# Altium footprint library coenv_PCBLIB.PcbLib: 25 footprints (part 2 of 2)
Each footprint in its own frame and in the unit in brackets; x right, y up, seen from the top. Pads: shape width x height; smd on the part's side, far side on the other; paste and mask are expansions set on the pad; w line width, h text height; cw(c..) or ccw(c..) is an arc to the next point about the centre after c.
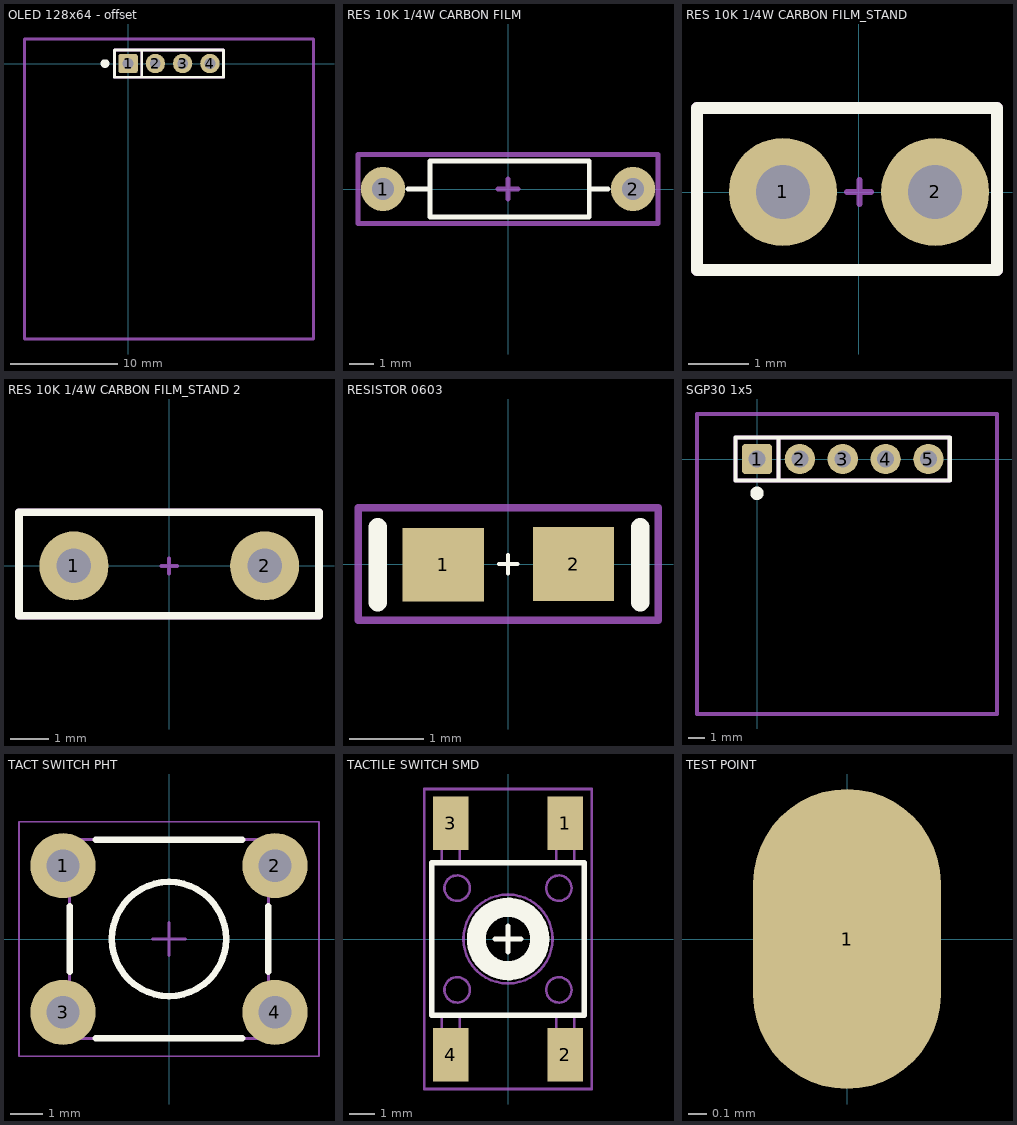
[diagram p1: the footprints below, top view; thin cyan lines are the x and y axes]

## OLED 128x64 - offset [mm] "PinHeader 1x4 TH Pitch 2.54mm"
height 9.5
pads (4):
  rrect25% 1.8x1.8 hole 1: 1(0,0)
  round 1.8 hole 1: 2(2.54,0) 3(5.08,0) 4(7.62,0)
Top Overlay:
  circle w0.5: c-2.15,0 r0.15
  lines w0.254: 1.27,-1.27 1.27,1.27 -1.27,1.27 ; -1.27,1.27 -1.27,-1.27 8.89,-1.27 8.89,1.27 -1.27,1.27
Mechanical 3:
  lines w0.254: 1.27,-1.27 1.27,1.27 -1.27,1.27 ; -1.27,1.27 -1.27,-1.27 8.89,-1.27 8.89,1.27 -1.27,1.27
Mechanical 15:
  lines w0.254: -9.652,-25.654 -9.652,2.286 17.272,2.286 17.272,-25.654 -9.652,-25.654
3D body "OLED-128x64-0.96.step": height 39.57, standoff 28.73, extent -9.525,-25.614 17.175,2.246

## RES 10K 1/4W CARBON FILM [mm]
pads (2):
  round 1.8 hole 0.9: 1(-5.08,0) 2(5.08,0)
Top Overlay:
  lines w0.2: -4.064,0 -3.175,0 ; 3.302,0 4.064,0 ; -3.175,-1.143 -3.175,1.143 3.302,1.143 3.302,-1.143 -3.175,-1.143
Mechanical 15:
  lines w0.2: -0.4,0 0.4,0 ; 0,-0.4 0,0.4 ; -6.096,-1.4 6.096,-1.4 6.096,1.4 -6.096,1.4 -6.096,-1.4
Mechanical 29:
  text "1" at -3.937,-1.016 h0.5
  text ".Designator" at -5.9,1.8 h0.5
3D body "RES 10K .25W CARBON FILM.STEP": height 3.27, standoff -1.27, extent -5.473,-1.27 5.474,1.27

## RES 10K 1/4W CARBON FILM_STAND [mm]
pads (2):
  round 1.8 hole 0.9: 1(-1.27,0) 2(1.27,0)
Top Overlay:
  lines w0.2: -2.7,-1.3 -2.7,1.4 2.3,1.4 2.3,-1.3 -2.7,-1.3
Mechanical 15:
  lines w0.1: -0.2,0 0.2,0 ; 0.01,-0.2 0.01,0.2
  lines w0.2: -2.7,-1.3 2.3,-1.3 2.3,1.4 -2.7,1.4 -2.7,-1.3
Mechanical 29:
  text "1" at -2.4,-1 h0.5
  text ".Designator" at -2.4,1.8 h0.5
3D body "RES 10K .25W CARBON FILM_STAND.STEP": height 7.82, standoff -2.03, extent -2.562,-1.2 1.562,1.34

## RES 10K 1/4W CARBON FILM_STAND 2 [mm]
pads (2):
  round 1.8 hole 0.9: 1(-2.485,0) 2(2.485,0)
Top Overlay:
  lines w0.2: -3.915,-1.3 -3.915,1.4 3.9,1.4 3.9,-1.3 -3.915,-1.3
Mechanical 15:
  lines w0.1: -0.2,0 0.2,0 ; -0.005,-0.2 -0.005,0.2
  lines w0.2: -3.915,-1.3 3.9,-1.3 3.9,1.4 -3.915,1.4 -3.915,-1.3
3D body "RES 10K .25W CARBON FILM_STAND.STEP": height 7.82, standoff -2.03, extent -3.777,-1.2 0.347,1.34

## RESISTOR 0603 [mm] "RES 5% 0603"
height 0.025
pads (2):
  rect 1.1x1 smd: 1(-0.877,-0.011) 2(0.889,0)
Top Overlay:
  lines w0.051: -0.127,0 0.127,0 ; 0,-0.127 0,0.127
  lines w0.254: -1.766,-0.519 -1.766,0.497 ; 1.79,-0.519 1.79,0.497
Mechanical 15:
  lines w0.102: -2.032,-0.762 -2.032,0.762 2.032,0.762 2.032,-0.762 -2.032,-0.762
3D body "SW3dPS-0603 SMD Resistor.STEP": height 0.3, standoff 0, extent -0.8,-0.4 0.8,0.4

## SGP30 1x5 [mm] "PinHeader 1x6 TH Pitch 2.54mm"
height 9.5
pads (5):
  rrect25% 1.8x1.8 hole 1: 1(0,0)
  round 1.8 hole 1: 2(2.54,0) 3(5.08,0) 4(7.62,0) 5(10.16,0)
Top Overlay:
  circle w0.5: c0,-2.032 r0.15
  lines w0.254: 1.27,-1.27 1.27,1.27 -1.27,1.27 ; -1.27,1.27 11.43,1.27 11.43,-1.27 -1.27,-1.27 -1.27,1.27
Mechanical 3:
  lines w0.254: 1.27,-1.27 1.27,1.27 -1.27,1.27 ; -1.27,1.27 11.43,1.27 11.43,-1.27 -1.27,-1.27 -1.27,1.27
Mechanical 13:
  lines w0.254: -3.556,-15.113 -3.556,2.667 14.224,2.667 14.224,-15.113 -3.556,-15.113
3D body "Pin Header 1x3 TH Pitch 2.54mm.stp": height 5.99, standoff -6.7, extent 3.81,-1.27 11.43,1.27
3D body "Pin Header 1x3 TH Pitch 2.54mm.stp": height 5.99, standoff -6.7, extent -1.27,-1.27 6.35,1.27
3D body "Adafruit_VEML6070_breakout.stp": height 5.64, standoff 2.79, extent -1.27,-11.43 11.43,2.54

## TACT SWITCH PHT [mm] "Tactile Switch 6x6x7mm"
height 7
pads (4):
  round 2 hole 1: 1(-3.25,2.25) 2(3.25,2.25) 3(-3.25,-2.25) 4(3.25,-2.25)
Top Overlay:
  circle w0.2: c0,0 r1.75
  lines w0.2: -3.05,-1 -3.05,1 ; -2.25,-3.05 2.25,-3.05 ; -2.25,3.05 2.25,3.05 ; 3.05,-1 3.05,1
Mechanical 13:
  circle w0.1: c0,0 r1.75
  lines w0.1: -3.05,-3.05 3.05,-3.05 3.05,3.05 -3.05,3.05 -3.05,-3.05
Mechanical 15:
  lines w0.05: -4.6,-3.6 -4.6,3.6 4.6,3.6 4.6,-3.6 -4.6,-3.6
  lines w0.1: -0.5,0 0.5,0 ; 0,-0.5 0,0.5
Mechanical 29:
  text ".Designator" at 0,0 h2
3D body "TACT SWITCH 7MM.STEP": height 7, standoff -3.5, extent -3.95,-3.1 3.95,3.1

## TACTILE SWITCH SMD [mm] "TACTILE SWITCH 4.3MM"
height 4.3
pads (4):
  rect 1.4x2.1 smd: 1(2.25,4.55) 2(2.25,-4.55) 3(-2.25,4.55) 4(-2.25,-4.55)
Top Overlay:
  circle w0.75: c0,0 r1.25
  lines w0.2: -0.508,0 0.508,0 ; 0,-0.508 0,0.508 ; -3,-3 3,-3 3,3 -3,3 -3,-3
Mechanical 13:
  circle w0.1: c0,0 r1.75
  circle w0.1: c-2,2 r0.5
  circle w0.1: c2,-2 r0.5
  circle w0.1: c2,2 r0.5
  circle w0.1: c-2,-2 r0.5
  lines w0.1: -2.6,-3 -2.6,-4.5 -1.9,-4.5 -1.9,-3 ; -2.6,3 -2.6,4.5 -1.9,4.5 -1.9,3 ; 1.9,-3 1.9,-4.5 2.6,-4.5 2.6,-3 ; 1.9,3 1.9,4.5 2.6,4.5 2.6,3 ; -3,-3 3,-3 3,3 -3,3 -3,-3
Mechanical 15:
  lines w0.1: -0.508,0 0.508,0 ; 0,-0.508 0,0.508 ; -3.3,-5.9 -3.3,5.9 3.3,5.9 3.3,-5.9 -3.3,-5.9
Mechanical 29:
  text ".Designator" at 0,0 h1
3D body "TACT_SW_4p3mm.STEP": height 4.32, standoff 0.02, extent -3,-4.5 3,4.5

## TEST POINT [mm] "TEST POINT"
pads (1):
  oval 1x1.6 smd mask-0.125: 1(0,0)
Mechanical 29:
  text ".Designator" at 0,0 h1